# Altium footprint library LUMI_Handy_Soldering_LIB.PcbLib: 562 footprints (part 25 of 36)
Each footprint in its own frame and in the unit in brackets; x right, y up, seen from the top. Pads: shape width x height; smd on the part's side, far side on the other; paste and mask are expansions set on the pad; w line width, h text height; cw(c..) or ccw(c..) is an arc to the next point about the centre after c.
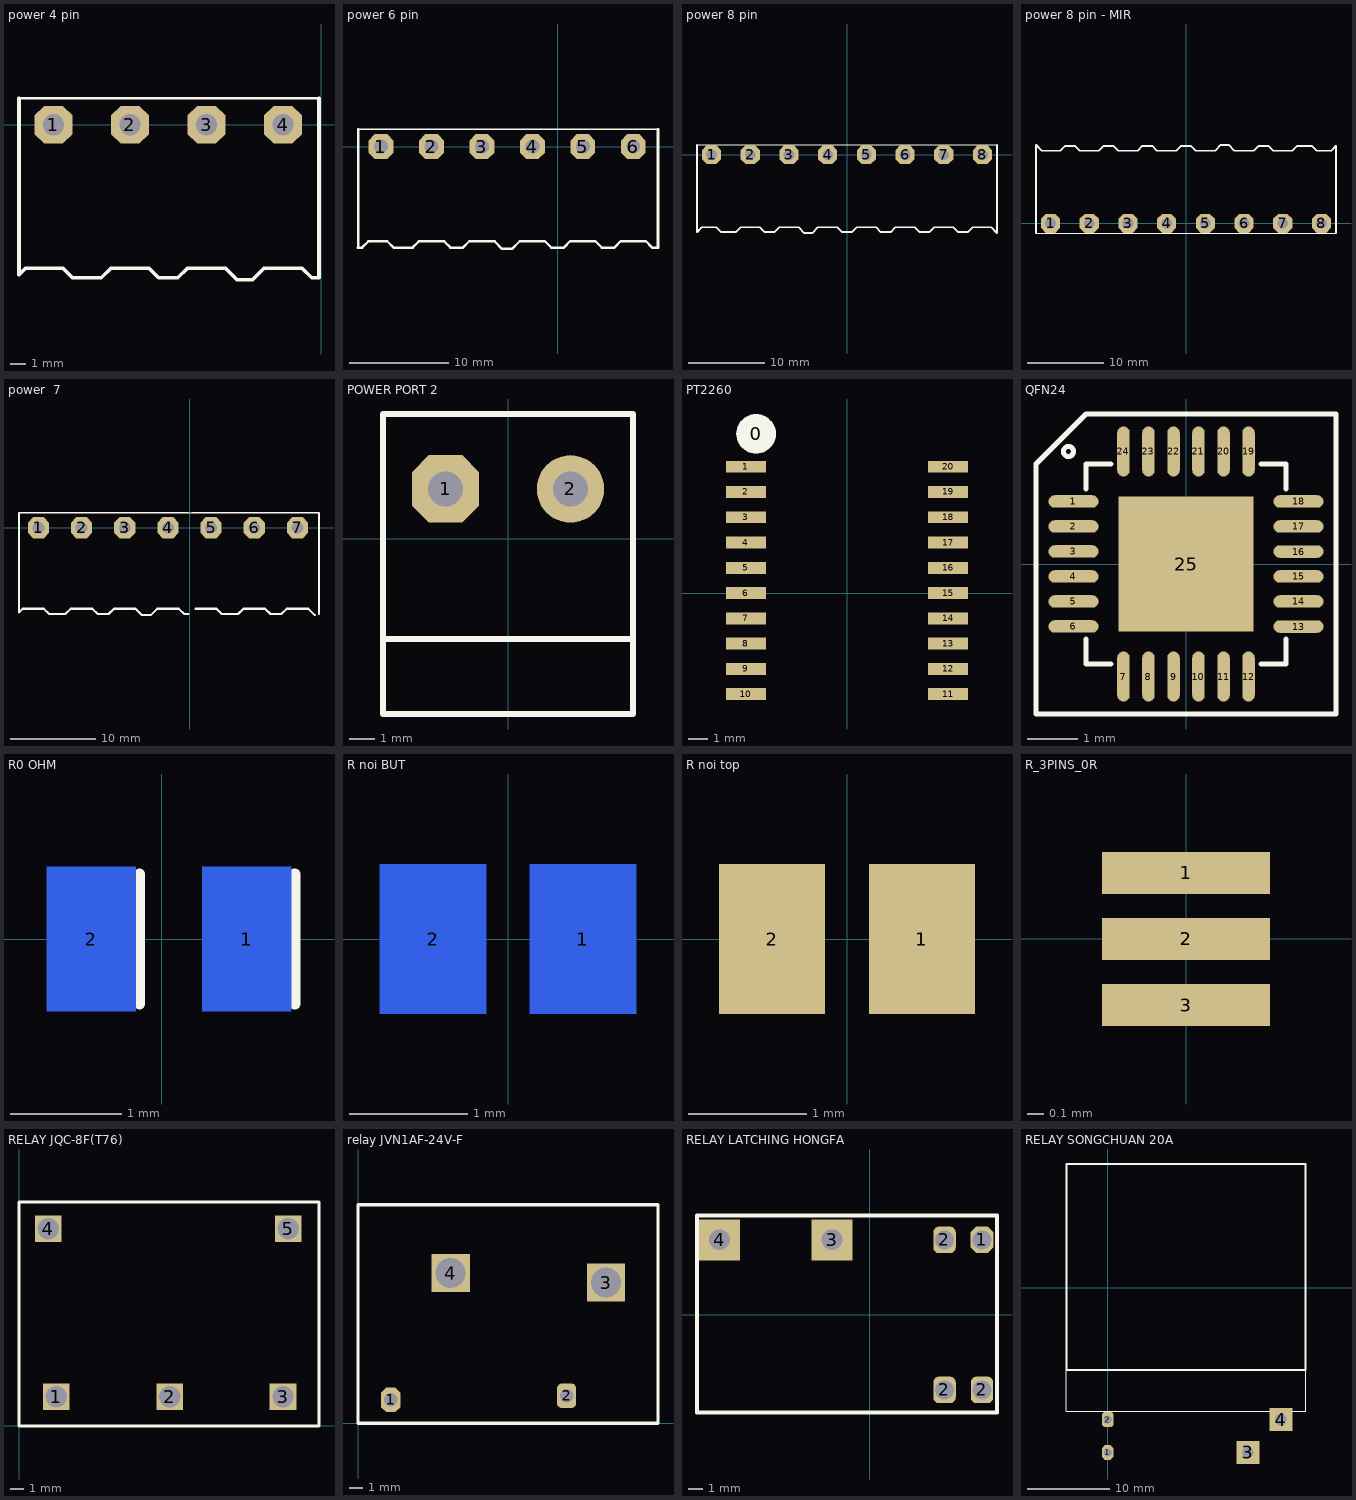
[diagram p24: the footprints below, top view; thin cyan lines are the x and y axes]

## power 4 pin [mm] "hkgvh"
pads (4):
  oct 2.5x2.5 hole 1.4: 1(-17.78,0) 2(-12.7,0) 3(-7.62,0) 4(-2.54,0)
Top Overlay:
  lines w0.15: -20.066,1.753 -0.152,1.753
  lines w0.254: -20.066,1.753 -20.066,0.86 -20.066,-0.111 -20.066,-1.206 -20.066,-6.921 -20.066,-9.957 -19.634,-9.525 -17.145,-9.525 -16.51,-10.16 -14.605,-10.16 -13.97,-9.525 -11.43,-9.525 -10.795,-10.16 -9.525,-10.16 -8.89,-9.525 -6.35,-9.525 -5.588,-10.287 -4.572,-10.287 -3.81,-9.525 -1.27,-9.525 -0.635,-10.16 -0.152,-10.16 -0.152,1.753
3D body: height 8.47, standoff -4, extent -20.153,-10.222 -10.153,1.778
3D body: height 8.47, standoff -4, extent -10.094,-10.222 -0.094,1.778

## power 6 pin [mm] "hkgvh"
pads (6):
  oct 2.5x2.5 hole 1.4: 1(-17.78,0) 2(-12.7,0) 3(-7.62,0) 4(-2.54,0) 5(2.54,0) 6(7.62,0)
Top Overlay:
  lines w0.15: -20.066,1.753 10.109,1.753
  lines w0.254: -20.066,1.753 -20.066,-10.135 -20.091,-10.16 -19.685,-10.16 -19.05,-9.525 -17.145,-9.525 -16.51,-10.16 -14.605,-10.16 -13.97,-9.525 -11.43,-9.525 -10.795,-10.16 -9.525,-10.16 -8.89,-9.525 -6.35,-9.525 -5.588,-10.287 -4.572,-10.287 -3.81,-9.525 -1.27,-9.525 -0.635,-10.16 0.635,-10.16 1.27,-9.525 3.81,-9.525 4.445,-10.16 5.715,-10.16 6.35,-9.525 8.89,-9.525 9.525,-10.16 10.109,-10.16 10.109,1.753
3D body: height 8.47, standoff -4, extent -20.153,-10.222 -10.153,1.778
3D body: height 8.47, standoff -4, extent -10.094,-10.222 -0.094,1.778
3D body: height 8.47, standoff -4, extent -0.025,-10.191 9.975,1.809

## power 8 pin [mm] "hkgvh"
pads (8):
  oct 2.5x2.5 hole 1.4: 1(-17.78,0) 2(-12.7,0) 3(-7.62,0) 4(-2.54,0) 5(2.54,0) 6(7.62,0) 7(12.7,0) 8(17.78,0)
Top Overlay:
  lines w0.15: -19.685,1.27 19.685,1.27
  lines w0.254: -19.685,1.27 -19.685,-10.16 -19.05,-9.525 -17.145,-9.525 -16.51,-10.16 -14.605,-10.16 -13.97,-9.525 -11.43,-9.525 -10.795,-10.16 -9.525,-10.16 -8.89,-9.525 -6.35,-9.525 -5.588,-10.287 -4.572,-10.287 -3.81,-9.525 -1.27,-9.525 -0.635,-10.16 0.635,-10.16 1.27,-9.525 3.81,-9.525 4.445,-10.16 5.715,-10.16 6.35,-9.525 8.89,-9.525 9.525,-10.16 10.795,-10.16 11.43,-9.525 13.97,-9.525 14.605,-10.16 15.875,-10.16 16.51,-9.525 18.923,-9.525 19.685,-10.287 19.685,1.27
3D body: height 8.47, standoff -4, extent 10.2,-10.273 20.2,1.727
3D body: height 8.47, standoff -4, extent 0.091,-10.323 10.091,1.677
3D body: height 8.47, standoff -4, extent -10.094,-10.222 -0.094,1.778
3D body: height 8.47, standoff -4, extent -20.153,-10.222 -10.153,1.778

## power 8 pin - MIR [mm] "hkgvh"
pads (8):
  oct 2.5x2.5 hole 1.4: 1(-17.78,0) 2(-12.7,0) 3(-7.62,0) 4(-2.54,0) 5(2.54,0) 6(7.62,0) 7(12.7,0) 8(17.78,0)
Top Overlay:
  lines w0.15: -19.685,-1.27 19.685,-1.27
  lines w0.254: -19.685,-1.27 -19.685,10.287 -18.923,9.525 -16.51,9.525 -15.875,10.16 -14.605,10.16 -13.97,9.525 -11.43,9.525 -10.795,10.16 -9.525,10.16 -8.89,9.525 -6.35,9.525 -5.715,10.16 -4.445,10.16 -3.81,9.525 -1.27,9.525 -0.635,10.16 0.635,10.16 1.27,9.525 3.81,9.525 4.572,10.287 5.588,10.287 6.35,9.525 8.89,9.525 9.525,10.16 10.795,10.16 11.43,9.525 13.97,9.525 14.605,10.16 16.51,10.16 17.145,9.525 19.05,9.525 19.685,10.16 19.685,-1.27

## power  7 [mm] "hkgvh"
pads (7):
  oct 2.5x2.5 hole 1.4: 1(-17.78,0) 2(-12.7,0) 3(-7.62,0) 4(-2.54,0) 5(2.54,0) 6(7.62,0) 7(12.7,0)
Top Overlay:
  lines w0.127: -0.152,1.753 0.254,1.753
  lines w0.15: -20.066,1.753 -0.152,1.753 ; 0.254,1.753 15.24,1.753
  lines w0.254: -20.066,1.753 -20.066,0.86 -20.066,-0.111 -20.066,-1.206 -20.066,-6.921 -20.066,-9.957 -19.634,-9.525 -17.145,-9.525 -16.51,-10.16 -14.605,-10.16 -13.97,-9.525 -11.43,-9.525 -10.795,-10.16 -9.525,-10.16 -8.89,-9.525 -6.35,-9.525 -5.588,-10.287 -4.572,-10.287 -3.81,-9.525 -1.27,-9.525 -0.635,-10.16 -0.152,-10.16 ; 0.686,-9.525 3.175,-9.525 3.81,-10.16 5.715,-10.16 6.35,-9.525 8.89,-9.525 9.525,-10.16 10.795,-10.16 11.43,-9.525 13.97,-9.525 14.732,-10.287 ; 15.24,-10.16 15.24,1.753
3D body: height 8.47, standoff -4, extent -10.094,-10.222 -0.094,1.778
3D body: height 8.47, standoff -4, extent -20.153,-10.222 -10.153,1.778
3D body: height 8.47, standoff -4, extent 0.167,-10.222 10.167,1.778
3D body: height 8.47, standoff -4, extent 5.146,-10.222 15.146,1.778

## POWER PORT 2 [mm]
pads (2):
  oct 2.7x2.7 hole 1.397: 1(-2.5,2)
  round 2.7 hole 1.397: 2(2.5,2)
Top Overlay:
  lines w0.254: -5,-4 5,-4 ; -5,-7 5,-7 5,5 -5,5 -5,-7
3D body: height 9, standoff -3.8, extent -5.612,-7.367 5.588,5.233

## PT2260 [mm]
pads (21):
  round 2 on Top Overlay: 0(-4.572,8.001)
  rect 2x0.6 smd: 1(-5.08,6.35) 2(-5.08,5.08) 3(-5.08,3.81) 4(-5.08,2.54) 5(-5.08,1.27) 6(-5.08,0) 7(-5.08,-1.27) 8(-5.08,-2.54) 9(-5.08,-3.81) 10(-5.08,-5.08) 11(5.08,-5.08) 12(5.08,-3.81) 13(5.08,-2.54) 14(5.08,-1.27) 15(5.08,0) 16(5.08,1.27) 17(5.08,2.54) 18(5.08,3.81) 19(5.08,5.08) 20(5.08,6.35)
3D body: height 2.8, standoff 0, extent -5.168,-5.865 5.168,7.135

## QFN24 [mm]
pads (25):
  oval 1x0.25 smd: 1(-2.25,1.25) 2(-2.25,0.75) 3(-2.25,0.25) 4(-2.25,-0.25) 5(-2.25,-0.75) 6(-2.25,-1.25) 13(2.25,-1.25) 14(2.25,-0.75) 15(2.25,-0.25) 16(2.25,0.25) 17(2.25,0.75) 18(2.25,1.25)
  oval 0.25x1 smd: 7(-1.25,-2.25) 8(-0.75,-2.25) 9(-0.25,-2.25) 10(0.25,-2.25) 11(0.75,-2.25) 12(1.25,-2.25) 19(1.25,2.25) 20(0.75,2.25) 21(0.25,2.25) 22(-0.25,2.25) 23(-0.75,2.25) 24(-1.25,2.25)
  rect 2.7x2.7 smd: 25(0,0)
Top Overlay:
  circle w0.1: c-2.35,2.25 r0.1
  lines w0.102: -2,-1.5 -2,-2 -1.5,-2 ; -2,1.5 -2,2 -1.5,2 ; 1.5,-2 2,-2 2,-1.5 ; 1.5,2 2,2 2,1.5 ; -3,-3 3,-3 3,3 -2,3 -3,2 -3,-3
3D body: height 1, standoff 0, extent -2,-2 2,2

## R0 OHM [mm] "Dung de noi khi han"
pads (2):
  rect 0.8x1.3 smd far side: 1(0.762,0) 2(-0.635,0)
Top Overlay:
  lines w0.1: -0.203,-0.584 -0.203,0.584 ; 1.194,-0.584 1.194,0.584

## R noi BUT [mm]
pads (2):
  rect 0.9x1.27 smd far side: 1(0.635,0) 2(-0.635,0)

## R noi top [mm]
pads (2):
  rect 0.9x1.27 smd: 1(0.635,0) 2(-0.635,0)

## R_3PINS_0R [mil]
pads (3):
  rect 40x10 smd: 1(0,15.75) 2(0,0) 3(0,-15.75)

## RELAY JQC-8F(T76) [mm]
pads (5):
  rect 2x2 hole 1.6: 1(2.8,2.2) 2(11.3,2.2) 3(19.8,2.2) 4(2.2,14.8) 5(20.2,14.8)
Top Overlay:
  lines w0.254: 0,0 22.5,0 22.5,16.8 0,16.8 0,0

## relay JVN1AF-24V-F [mm] "Relay 24V Panasonic"
pads (4):
  oct 1.4x1.8 hole 1: 1(2.4,1.7)
  rrect50% 1.4x1.8 hole 1: 2(15.3,2)
  rect 2.794x2.794 hole 2.2: 3(18.2,10.3) 4(6.8,11)
Top Overlay:
  lines w0.254: 0,0 0,16 22,16 22,0 0,0

## RELAY LATCHING HONGFA [mil]
pads (6):
  oct 60.12x70.87 hole 50: 1(300,200)
  rrect50% 60x70.87 hole 50: 2(200,-200) 2(200,200) 2(300,-200)
  rect 110x110 hole 55.12: 3(-100,200) 4(-400,200)
Top Overlay:
  lines w10: -460,-260 -460,264.72 340,264.72 340,-260 -460,-260

## RELAY SONGCHUAN 20A [mm]
pads (4):
  oct 1.4x1.8 hole 1: 1(0,-20)
  rrect50% 1.4x1.8 hole 1: 2(0,-16)
  rect 2.794x2.794 hole 1.4: 3(17,-20) 4(21,-16)
Top Overlay:
  lines w0.127: -5,-10 -5,-15 24,-15 24,-10
  lines w0.254: -5,-10 -5,15 24,15 24,-10 -5,-10
3D body: height 12.64, standoff 0.04, extent -5.074,-15 23.926,14.8